# Altium footprint library PCB-PCEIOT.PcbLib: 119 footprints (part 4 of 8)
Each footprint in its own frame and in the unit in brackets; x right, y up, seen from the top. Pads: shape width x height; smd on the part's side, far side on the other; paste and mask are expansions set on the pad; w line width, h text height; cw(c..) or ccw(c..) is an arc to the next point about the centre after c.
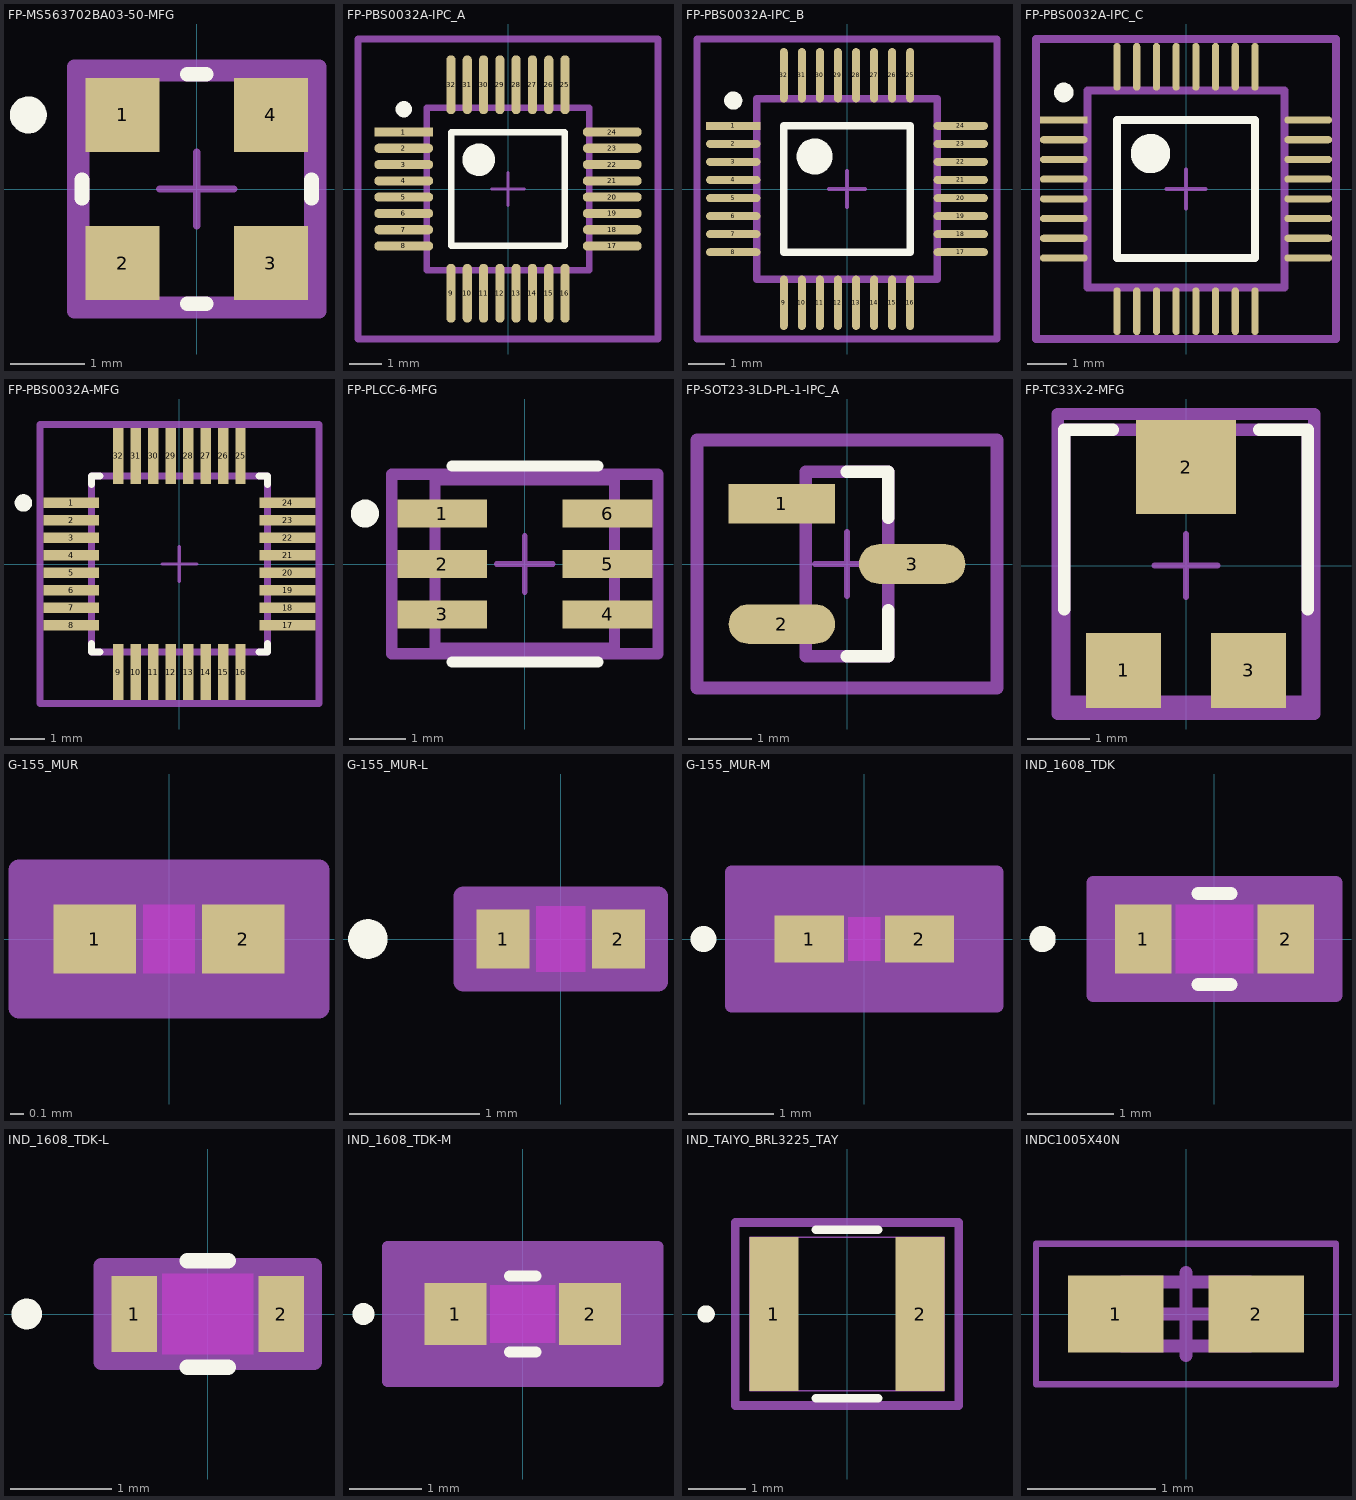
[diagram p3: the footprints below, top view; thin cyan lines are the x and y axes]

## FP-MS563702BA03-50-MFG [mm]
pads (4):
  rect 1x1 smd paste+0 mask+0.001: 1(-1,1) 2(-1,-1) 3(1,-1) 4(1,1)
Top Overlay:
  circle w0.25: c-2.275,1 r0.125
  lines w0.2: -1.55,-0.125 -1.55,0.125 ; -0.125,-1.55 0.125,-1.55 ; -0.125,1.55 0.125,1.55 ; 1.55,-0.125 1.55,0.125
Top 3D Body:
  lines w0.2: -1.55,-1.55 -1.55,1.55 1.55,1.55 1.55,-1.55 -1.55,-1.55
Top Courtyard:
  lines w0.2: -1.65,-1.65 -1.65,1.65 1.65,1.65 1.65,-1.65 -1.65,-1.65
Top Assembly:
  lines w0.2: -1.65,-1.65 -1.65,1.65 1.65,1.65 1.65,-1.65 -1.65,-1.65
  text ".Designator" at 0,0.188 h1
Top Component Center:
  lines w0.1: -0.5,0 0.5,0 ; 0,-0.5 0,0.5
3D body "IC_Measurement_Specialties_MS563702BA03-50_eec.STEP": height 0.25, standoff 0, extent -1.65,-1.65 1.65,1.65

## FP-PBS0032A-IPC_A [mm]
pads (32):
  rect 1.809x0.283 smd paste+0 mask+0: 1(-3.202,1.75)
  rrect100% 1.809x0.283 smd paste+0 mask+0: 2(-3.202,1.25) 3(-3.202,0.75) 4(-3.202,0.25) 5(-3.202,-0.25) 6(-3.202,-0.75) 7(-3.202,-1.25) 8(-3.202,-1.75) 17(3.202,-1.75) 18(3.202,-1.25) 19(3.202,-0.75) 20(3.202,-0.25) 21(3.202,0.25) 22(3.202,0.75) 23(3.202,1.25) 24(3.202,1.75)
  rrect100% 0.283x1.809 smd paste+0 mask+0: 9(-1.75,-3.202) 10(-1.25,-3.202) 11(-0.75,-3.202) 12(-0.25,-3.202) 13(0.25,-3.202) 14(0.75,-3.202) 15(1.25,-3.202) 16(1.75,-3.202) 25(1.75,3.202) 26(1.25,3.202) 27(0.75,3.202) 28(0.25,3.202) 29(-0.25,3.202) 30(-0.75,3.202) 31(-1.25,3.202) 32(-1.75,3.202)
Top Overlay:
  circle w0.25: c-3.202,2.45 r0.125
  circle w0.5: c-0.9,0.9 r0.25
  lines w0.2: -1.75,-1.75 1.75,-1.75 1.75,1.75 -1.75,1.75 -1.75,-1.75
Top 3D Body:
  lines w0.2: -2.5,-2.5 2.5,-2.5 2.5,2.5 -2.5,2.5 -2.5,-2.5
Top Courtyard:
  lines w0.2: -4.606,-4.606 4.606,-4.606 4.606,4.606 -4.606,4.606 -4.606,-4.606
Top Assembly:
  lines w0.2: -4.606,-4.606 4.606,-4.606 4.606,4.606 -4.606,4.606 -4.606,-4.606
  text ".Designator" at 0,0 h1
Top Component Center:
  lines w0.1: -0.5,0 0.5,0 ; 0,-0.5 0,0.5

## FP-PBS0032A-IPC_B [mm]
pads (32):
  rect 1.509x0.223 smd paste+0 mask+0: 1(-3.152,1.75)
  rrect100% 1.509x0.223 smd paste+0 mask+0: 2(-3.152,1.25) 3(-3.152,0.75) 4(-3.152,0.25) 5(-3.152,-0.25) 6(-3.152,-0.75) 7(-3.152,-1.25) 8(-3.152,-1.75) 17(3.152,-1.75) 18(3.152,-1.25) 19(3.152,-0.75) 20(3.152,-0.25) 21(3.152,0.25) 22(3.152,0.75) 23(3.152,1.25) 24(3.152,1.75)
  rrect100% 0.223x1.509 smd paste+0 mask+0: 9(-1.75,-3.152) 10(-1.25,-3.152) 11(-0.75,-3.152) 12(-0.25,-3.152) 13(0.25,-3.152) 14(0.75,-3.152) 15(1.25,-3.152) 16(1.75,-3.152) 25(1.75,3.152) 26(1.25,3.152) 27(0.75,3.152) 28(0.25,3.152) 29(-0.25,3.152) 30(-0.75,3.152) 31(-1.25,3.152) 32(-1.75,3.152)
Top Overlay:
  circle w0.5: c-0.9,0.9 r0.25
  circle w0.25: c-3.152,2.45 r0.125
  lines w0.2: -1.75,-1.75 -1.75,1.75 1.75,1.75 1.75,-1.75 -1.75,-1.75
Top 3D Body:
  lines w0.2: -2.5,-2.5 -2.5,2.5 2.5,2.5 2.5,-2.5 -2.5,-2.5
Top Courtyard:
  lines w0.2: -4.156,-4.156 -4.156,4.156 4.156,4.156 4.156,-4.156 -4.156,-4.156
Top Assembly:
  lines w0.2: -4.156,-4.156 -4.156,4.156 4.156,4.156 4.156,-4.156 -4.156,-4.156
  text ".Designator" at 0,0 h1
Top Component Center:
  lines w0.1: -0.5,0 0.5,0 ; 0,-0.5 0,0.5

## FP-PBS0032A-IPC_C [mm]
pads (32):
  rect 1.209x0.183 smd paste+0 mask+0: 1(-3.102,1.75)
  rrect100% 1.209x0.183 smd paste+0 mask+0: 2(-3.102,1.25) 3(-3.102,0.75) 4(-3.102,0.25) 5(-3.102,-0.25) 6(-3.102,-0.75) 7(-3.102,-1.25) 8(-3.102,-1.75) 17(3.102,-1.75) 18(3.102,-1.25) 19(3.102,-0.75) 20(3.102,-0.25) 21(3.102,0.25) 22(3.102,0.75) 23(3.102,1.25) 24(3.102,1.75)
  rrect100% 0.183x1.209 smd paste+0 mask+0: 9(-1.75,-3.102) 10(-1.25,-3.102) 11(-0.75,-3.102) 12(-0.25,-3.102) 13(0.25,-3.102) 14(0.75,-3.102) 15(1.25,-3.102) 16(1.75,-3.102) 25(1.75,3.102) 26(1.25,3.102) 27(0.75,3.102) 28(0.25,3.102) 29(-0.25,3.102) 30(-0.75,3.102) 31(-1.25,3.102) 32(-1.75,3.102)
Top Overlay:
  circle w0.25: c-3.102,2.45 r0.125
  circle w0.5: c-0.9,0.9 r0.25
  lines w0.2: -1.75,-1.75 1.75,-1.75 1.75,1.75 -1.75,1.75 -1.75,-1.75
Top 3D Body:
  lines w0.2: -2.5,-2.5 2.5,-2.5 2.5,2.5 -2.5,2.5 -2.5,-2.5
Top Courtyard:
  lines w0.2: -3.806,-3.806 3.806,-3.806 3.806,3.806 -3.806,3.806 -3.806,-3.806
Top Assembly:
  lines w0.2: -3.806,-3.806 3.806,-3.806 3.806,3.806 -3.806,3.806 -3.806,-3.806
  text ".Designator" at 0,0 h1
Top Component Center:
  lines w0.1: -0.5,0 0.5,0 ; 0,-0.5 0,0.5

## FP-PBS0032A-MFG [mm]
pads (32):
  rect 1.6x0.3 smd paste-1000 mask+0: 1(-3.1,1.75) 2(-3.1,1.25) 3(-3.1,0.75) 4(-3.1,0.25) 5(-3.1,-0.25) 6(-3.1,-0.75) 7(-3.1,-1.25) 8(-3.1,-1.75) 17(3.1,-1.75) 18(3.1,-1.25) 19(3.1,-0.75) 20(3.1,-0.25) 21(3.1,0.25) 22(3.1,0.75) 23(3.1,1.25) 24(3.1,1.75)
  rect 0.3x1.6 smd paste-1000 mask+0: 9(-1.75,-3.1) 10(-1.25,-3.1) 11(-0.75,-3.1) 12(-0.25,-3.1) 13(0.25,-3.1) 14(0.75,-3.1) 15(1.25,-3.1) 16(1.75,-3.1) 25(1.75,3.1) 26(1.25,3.1) 27(0.75,3.1) 28(0.25,3.1) 29(-0.25,3.1) 30(-0.75,3.1) 31(-1.25,3.1) 32(-1.75,3.1)
Top Overlay:
  circle w0.25: c-4.475,1.75 r0.125
  lines w0.2: -2.525,-2.275 -2.525,-2.525 -2.275,-2.525 ; -2.525,2.275 -2.525,2.525 -2.275,2.525 ; 2.275,-2.525 2.525,-2.525 2.525,-2.275 ; 2.275,2.525 2.525,2.525 2.525,2.275
Top Paste:
  rectangle: 2.325,1.625 3.875,1.875
  rectangle: 2.325,1.125 3.875,1.375
  rectangle: 2.325,0.625 3.875,0.875
  rectangle: 2.325,0.125 3.875,0.375
  rectangle: 2.325,-0.375 3.875,-0.125
  rectangle: 2.325,-0.875 3.875,-0.625
  rectangle: 2.325,-1.375 3.875,-1.125
  rectangle: 2.325,-1.875 3.875,-1.625
  rectangle: -3.875,-1.875 -2.325,-1.625
  rectangle: -3.875,-1.375 -2.325,-1.125
  rectangle: -3.875,-0.875 -2.325,-0.625
  rectangle: -3.875,-0.375 -2.325,-0.125
  rectangle: -3.875,0.125 -2.325,0.375
  rectangle: -3.875,0.625 -2.325,0.875
  rectangle: -3.875,1.125 -2.325,1.375
  rectangle: -3.875,1.625 -2.325,1.875
  rectangle: 1.625,-3.875 1.875,-2.325
  rectangle: 1.125,-3.875 1.375,-2.325
  rectangle: 0.625,-3.875 0.875,-2.325
  rectangle: 0.125,-3.875 0.375,-2.325
  rectangle: -0.375,-3.875 -0.125,-2.325
  rectangle: -0.875,-3.875 -0.625,-2.325
  rectangle: -1.375,-3.875 -1.125,-2.325
  rectangle: -1.875,-3.875 -1.625,-2.325
  rectangle: -1.875,2.325 -1.625,3.875
  rectangle: -1.375,2.325 -1.125,3.875
  rectangle: -0.875,2.325 -0.625,3.875
  rectangle: -0.375,2.325 -0.125,3.875
  rectangle: 0.125,2.325 0.375,3.875
  rectangle: 0.625,2.325 0.875,3.875
  rectangle: 1.125,2.325 1.375,3.875
  rectangle: 1.625,2.325 1.875,3.875
Top 3D Body:
  lines w0.2: -2.525,-2.525 -2.525,2.525 2.525,2.525 2.525,-2.525 -2.525,-2.525
Top Courtyard:
  lines w0.2: -4,-4 -4,4 4,4 4,-4 -4,-4
Top Assembly:
  lines w0.2: -4,-4 -4,4 4,4 4,-4 -4,-4
  text ".Designator" at 0,0.188 h1
Top Component Center:
  lines w0.1: -0.5,0 0.5,0 ; 0,-0.5 0,0.5
3D body "IC_Texas_Instruments_TVP5150AM1PBSR_eec.STEP": height 0.25, standoff 0, extent -4,-4 4,4

## FP-PLCC-6-MFG [mm]
pads (6):
  rect 1.6x0.5 smd paste+0 mask+0.05: 1(-1.475,0.9) 2(-1.475,0) 3(-1.475,-0.9) 4(1.475,-0.9) 5(1.475,0) 6(1.475,0.9)
Top Overlay:
  circle w0.25: c-2.85,0.9 r0.125
  lines w0.2: -1.3,-1.75 1.3,-1.75 ; -1.3,1.75 1.3,1.75
Top 3D Body:
  lines w0.2: -1.6,-1.5 -1.6,1.5 1.6,1.5 1.6,-1.5 -1.6,-1.5
Top Courtyard:
  lines w0.2: -2.375,-1.6 -2.375,1.6 2.375,1.6 2.375,-1.6 -2.375,-1.6
Top Assembly:
  lines w0.2: -2.375,-1.6 -2.375,1.6 2.375,1.6 2.375,-1.6 -2.375,-1.6
  text ".Designator" at 0,0.188 h1
Top Component Center:
  lines w0.1: -0.5,0 0.5,0 ; 0,-0.5 0,0.5
3D body "Diode_Broadcom_ASMT-YTD7-0AA02_eec.STEP": height 0.25, standoff 0, extent -2.375,-1.6 2.375,1.6

## FP-SOT23-3LD-PL-1-IPC_A [mm]
pads (3):
  rect 1.684x0.627 smd paste+0 mask+0: 1(-1.03,0.95)
  rrect100% 1.684x0.627 smd paste+0 mask+0: 2(-1.03,-0.95) 3(1.03,0)
Top Overlay:
  lines w0.2: 0,-1.46 0.65,-1.46 0.65,-0.73 ; 0,1.46 0.65,1.46 0.65,0.73
Top 3D Body:
  lines w0.2: -0.65,-1.46 0.65,-1.46 0.65,1.46 -0.65,1.46 -0.65,-1.46
Top Courtyard:
  lines w0.2: -2.372,-1.96 2.372,-1.96 2.372,1.96 -2.372,1.96 -2.372,-1.96
Top Assembly:
  lines w0.2: -2.372,-1.96 2.372,-1.96 2.372,1.96 -2.372,1.96 -2.372,-1.96
  text ".Designator" at 0,0 h1
Top Component Center:
  lines w0.1: -0.5,0 0.5,0 ; 0,-0.5 0,0.5
3D body "IC_Microchip_LM4040DYM3-2_5-TR_eec.STEP": height 0.25, standoff 0, extent -2.372,-1.96 2.372,1.96

## FP-TC33X-2-MFG [mm]
height 0.6
pads (3):
  rect 1.2x1.2 smd paste+0 mask+0: 1(-1,-1.675) 3(1,-1.675)
  rect 1.6x1.5 smd paste+0 mask+0: 2(0,1.575)
Top Overlay:
  lines w0.2: -1.95,-0.7 -1.95,2.175 -1.175,2.175 ; 1.175,2.175 1.95,2.175 1.95,-0.7
Top 3D Body:
  lines w0.2: -1.95,-2.175 1.95,-2.175 1.95,2.175 -1.95,2.175 -1.95,-2.175
Top Courtyard:
  lines w0.2: -2.05,-2.375 2.05,-2.375 2.05,2.425 -2.05,2.425 -2.05,-2.375
Top Assembly:
  lines w0.2: -2.05,-2.375 2.05,-2.375 2.05,2.425 -2.05,2.425 -2.05,-2.375
  text ".Designator" at 0,0.025 h1
Top Component Center:
  lines w0.1: -0.5,0 0.5,0 ; 0,-0.5 0,0.5
3D body "Res_Bourns_TC33X-2-104E_eec.STEP": height 1.5, standoff 0, extent -1.8,-1.9 1.8,1.9

## G-155_MUR [mil]
pads (2):
  rect 24x20 smd paste+0 mask+0: 1(-21.5,0) 2(21.5,0)
Top Layer keep-out:
  region: -7.5,-8 -7.5,8 7.5,8 7.5,-8
Keep-Out Layer:
  region: -7.5,-10 -7.5,10 7.5,10 7.5,-10
Mechanical 13:
  lines w1: -19.5,-10 -19.5,10 ; -19.5,-10 -9.5,-10 -9.5,10 -19.5,10 ; -19.5,-10 19.5,-10 ; -19.5,-10 -19.5,10 ; -19.5,10 19.5,10 ; 19.5,-10 9.5,-10 9.5,10 19.5,10 ; 19.5,-10 19.5,10 ; 19.5,-10 19.5,10
Mechanical 15:
  region: 43.5,-20 -43.5,-20 -43.5,20 43.5,20
  lines w6: -43.5,-20 -43.5,20 43.5,20 43.5,-20 -43.5,-20
3D body "G-155_MUR.step": height 22.01, standoff 0, extent -19.49,-10 19.49,10

## G-155_MUR-L [mil]
pads (2):
  rect 16x18 smd paste+0 mask+0: 1(-17.5,0) 2(17.5,0)
Top Layer keep-out:
  region: -7.5,-8 -7.5,8 7.5,8 7.5,-8
Top Overlay:
  circle w6: c-58.5,0 r3
Keep-Out Layer:
  region: -7.5,-10 -7.5,10 7.5,10 7.5,-10
Mechanical 13:
  circle w1: c-12.5,0 r3
  lines w1: -19.5,-10 -19.5,10 ; -19.5,-10 -9.5,-10 -9.5,10 -19.5,10 ; -19.5,-10 19.5,-10 ; -19.5,-10 -19.5,10 ; -19.5,10 19.5,10 ; 19.5,-10 9.5,-10 9.5,10 19.5,10 ; 19.5,-10 19.5,10 ; 19.5,-10 19.5,10
Mechanical 15:
  region: 29.5,-13 -29.5,-13 -29.5,13 29.5,13
  lines w6: -29.5,-13 -29.5,13 29.5,13 29.5,-13 -29.5,-13
3D body "G-155_MUR.step": height 22.01, standoff 0, extent -19.49,-10 19.49,10

## G-155_MUR-M [mil]
pads (2):
  rect 32x22 smd paste+0 mask+0: 1(-25.5,0) 2(25.5,0)
Top Layer keep-out:
  region: -7.5,-8 -7.5,8 7.5,8 7.5,-8
Top Overlay:
  circle w6: c-74.5,0 r3
Keep-Out Layer:
  region: -7.5,-10 -7.5,10 7.5,10 7.5,-10
Mechanical 13:
  circle w1: c-20.5,0 r3
  lines w1: -19.5,-10 -19.5,10 ; -19.5,-10 -9.5,-10 -9.5,10 -19.5,10 ; -19.5,-10 19.5,-10 ; -19.5,-10 -19.5,10 ; -19.5,10 19.5,10 ; 19.5,-10 9.5,-10 9.5,10 19.5,10 ; 19.5,-10 19.5,10 ; 19.5,-10 19.5,10
Mechanical 15:
  region: 61.5,-31 -61.5,-31 -61.5,31 61.5,31
  lines w6: -61.5,-31 -61.5,31 61.5,31 61.5,-31 -61.5,-31
3D body "G-155_MUR.step": height 22.01, standoff 0, extent -19.49,-10 19.49,10

## IND_1608_TDK [mm]
pads (2):
  rect 0.656x0.8 smd paste+0 mask+0: 1(-0.828,0) 2(0.828,0)
Top Layer keep-out:
  region: -0.449,-0.349 -0.449,0.349 0.449,0.349 0.449,-0.349
Top Overlay:
  circle w0.152: c-1.994,0 r0.076
  lines w0.152: -0.192,-0.527 0.192,-0.527 ; -0.192,0.527 0.192,0.527
  text ".Designator" at -3.492,-0.635 h1.27
Keep-Out Layer:
  region: -0.449,-0.4 -0.449,0.4 0.449,0.4 0.449,-0.4
Mechanical 13:
  circle w0.025: c-0.701,0 r0.076
  lines w0.025: -0.8,-0.4 -0.8,0.4 ; -0.8,-0.4 0.8,-0.4 ; -0.8,-0.4 -0.5,-0.4 -0.5,0.4 -0.8,0.4 ; -0.8,-0.4 -0.8,0.4 ; -0.8,0.4 0.8,0.4 ; 0.8,-0.4 0.8,0.4 ; 0.8,-0.4 0.8,0.4 ; 0.8,-0.4 0.5,-0.4 0.5,0.4 0.8,0.4
  text ".Designator" at -3.492,-0.635 h1.27
Mechanical 15:
  region: 1.41,-0.654 -1.41,-0.654 -1.41,0.654 1.41,0.654
  lines w0.152: -1.41,-0.654 1.41,-0.654 1.41,0.654 -1.41,0.654 -1.41,-0.654
3D body "IND_1608_TDK.step": height 0.8, standoff 0, extent -0.8,-0.4 0.8,0.4

## IND_1608_TDK-L [mm]
pads (2):
  rect 0.452x0.749 smd paste+0 mask+0: 1(-0.726,0) 2(0.726,0)
Top Layer keep-out:
  region: -0.449,-0.349 -0.449,0.349 0.449,0.349 0.449,-0.349
Top Overlay:
  circle w0.152: c-1.791,0 r0.076
  lines w0.152: -0.204,-0.527 0.204,-0.527 ; -0.204,0.527 0.204,0.527
  text ".Designator" at -3.492,-0.635 h1.27
Keep-Out Layer:
  region: -0.449,-0.4 -0.449,0.4 0.449,0.4 0.449,-0.4
Mechanical 13:
  circle w0.025: c-0.599,0 r0.076
  lines w0.025: -0.8,-0.4 -0.8,0.4 ; -0.8,-0.4 0.8,-0.4 ; -0.8,-0.4 -0.5,-0.4 -0.5,0.4 -0.8,0.4 ; -0.8,-0.4 -0.8,0.4 ; -0.8,0.4 0.8,0.4 ; 0.8,-0.4 0.8,0.4 ; 0.8,-0.4 0.8,0.4 ; 0.8,-0.4 0.5,-0.4 0.5,0.4 0.8,0.4
  text ".Designator" at -3.492,-0.635 h1.27
Mechanical 15:
  region: 1.054,-0.476 -1.054,-0.476 -1.054,0.476 1.054,0.476
  lines w0.152: -1.054,-0.476 1.054,-0.476 1.054,0.476 -1.054,0.476 -1.054,-0.476
3D body "IND_1608_TDK.step": height 0.8, standoff 0, extent -0.8,-0.4 0.8,0.4

## IND_1608_TDK-M [mm]
pads (2):
  rect 0.859x0.851 smd paste+0 mask+0: 1(-0.929,0) 2(0.929,0)
Top Layer keep-out:
  region: -0.449,-0.349 -0.449,0.349 0.449,0.349 0.449,-0.349
Top Overlay:
  circle w0.152: c-2.197,0 r0.076
  lines w0.152: -0.183,-0.527 0.183,-0.527 ; -0.183,0.527 0.183,0.527
  text ".Designator" at -3.492,-0.635 h1.27
Keep-Out Layer:
  region: -0.449,-0.4 -0.449,0.4 0.449,0.4 0.449,-0.4
Mechanical 13:
  circle w0.025: c-0.802,0 r0.076
  lines w0.025: -0.8,-0.4 -0.8,0.4 ; -0.8,-0.4 0.8,-0.4 ; -0.8,-0.4 -0.5,-0.4 -0.5,0.4 -0.8,0.4 ; -0.8,-0.4 -0.8,0.4 ; -0.8,0.4 0.8,0.4 ; 0.8,-0.4 0.8,0.4 ; 0.8,-0.4 0.8,0.4 ; 0.8,-0.4 0.5,-0.4 0.5,0.4 0.8,0.4
  text ".Designator" at -3.492,-0.635 h1.27
Mechanical 15:
  region: 1.867,-0.933 -1.867,-0.933 -1.867,0.933 1.867,0.933
  lines w0.152: -1.867,-0.933 1.867,-0.933 1.867,0.933 -1.867,0.933 -1.867,-0.933
3D body "IND_1608_TDK.step": height 0.8, standoff 0, extent -0.8,-0.4 0.8,0.4

## IND_TAIYO_BRL3225_TAY [mil]
pads (2):
  rect 33.5x106 smd paste+0 mask+0: 1(-50.25,0) 2(50.25,0)
Top Overlay:
  circle w6: c-97,0 r3
  lines w6: -21.39,-58 21.39,-58 ; -21.39,58 21.39,58
Mechanical 13:
  circle w1: c-64,0 r3
  lines w1: -67,-53 67,-53 67,53 -67,53 -67,-53
Mechanical 15:
  lines w6: -77,-63 -77,63 77,63 77,-63 -77,-63
3D body "IND_TAIYO_BRL3225_TAY.step": height 68.11, standoff -0.12, extent -67.01,-53.11 67.01,53.11

## INDC1005X40N [mm] "Chip Inductor, 2-Leads, Body 1,0x0,50mm (0402), IPC Medium Density"
pads (2):
  rect 0.75x0.6 smd: 1(-0.55,0) 2(0.55,0)
Mechanical 13:
  lines w0.1: -0.5,-0.25 0.5,-0.25 0.5,0.25 -0.5,0.25 -0.5,-0.25
Mechanical 15:
  lines w0.05: -1.175,-0.55 1.175,-0.55 1.175,0.55 -1.175,0.55 -1.175,-0.55
  lines w0.1: -0.325,0 0.325,0 ; 0,-0.325 0,0.325
  text ".Designator" at 0.272,-2.705 h1.2
3D body "INDC-0402.stp": height 0.55, standoff 0, extent -0.525,-0.275 0.525,0.275